# Altium footprint library iMag.PcbLib: 77 footprints (part 2 of 5)
Each footprint in its own frame and in the unit in brackets; x right, y up, seen from the top. Pads: shape width x height; smd on the part's side, far side on the other; paste and mask are expansions set on the pad; w line width, h text height; cw(c..) or ccw(c..) is an arc to the next point about the centre after c.
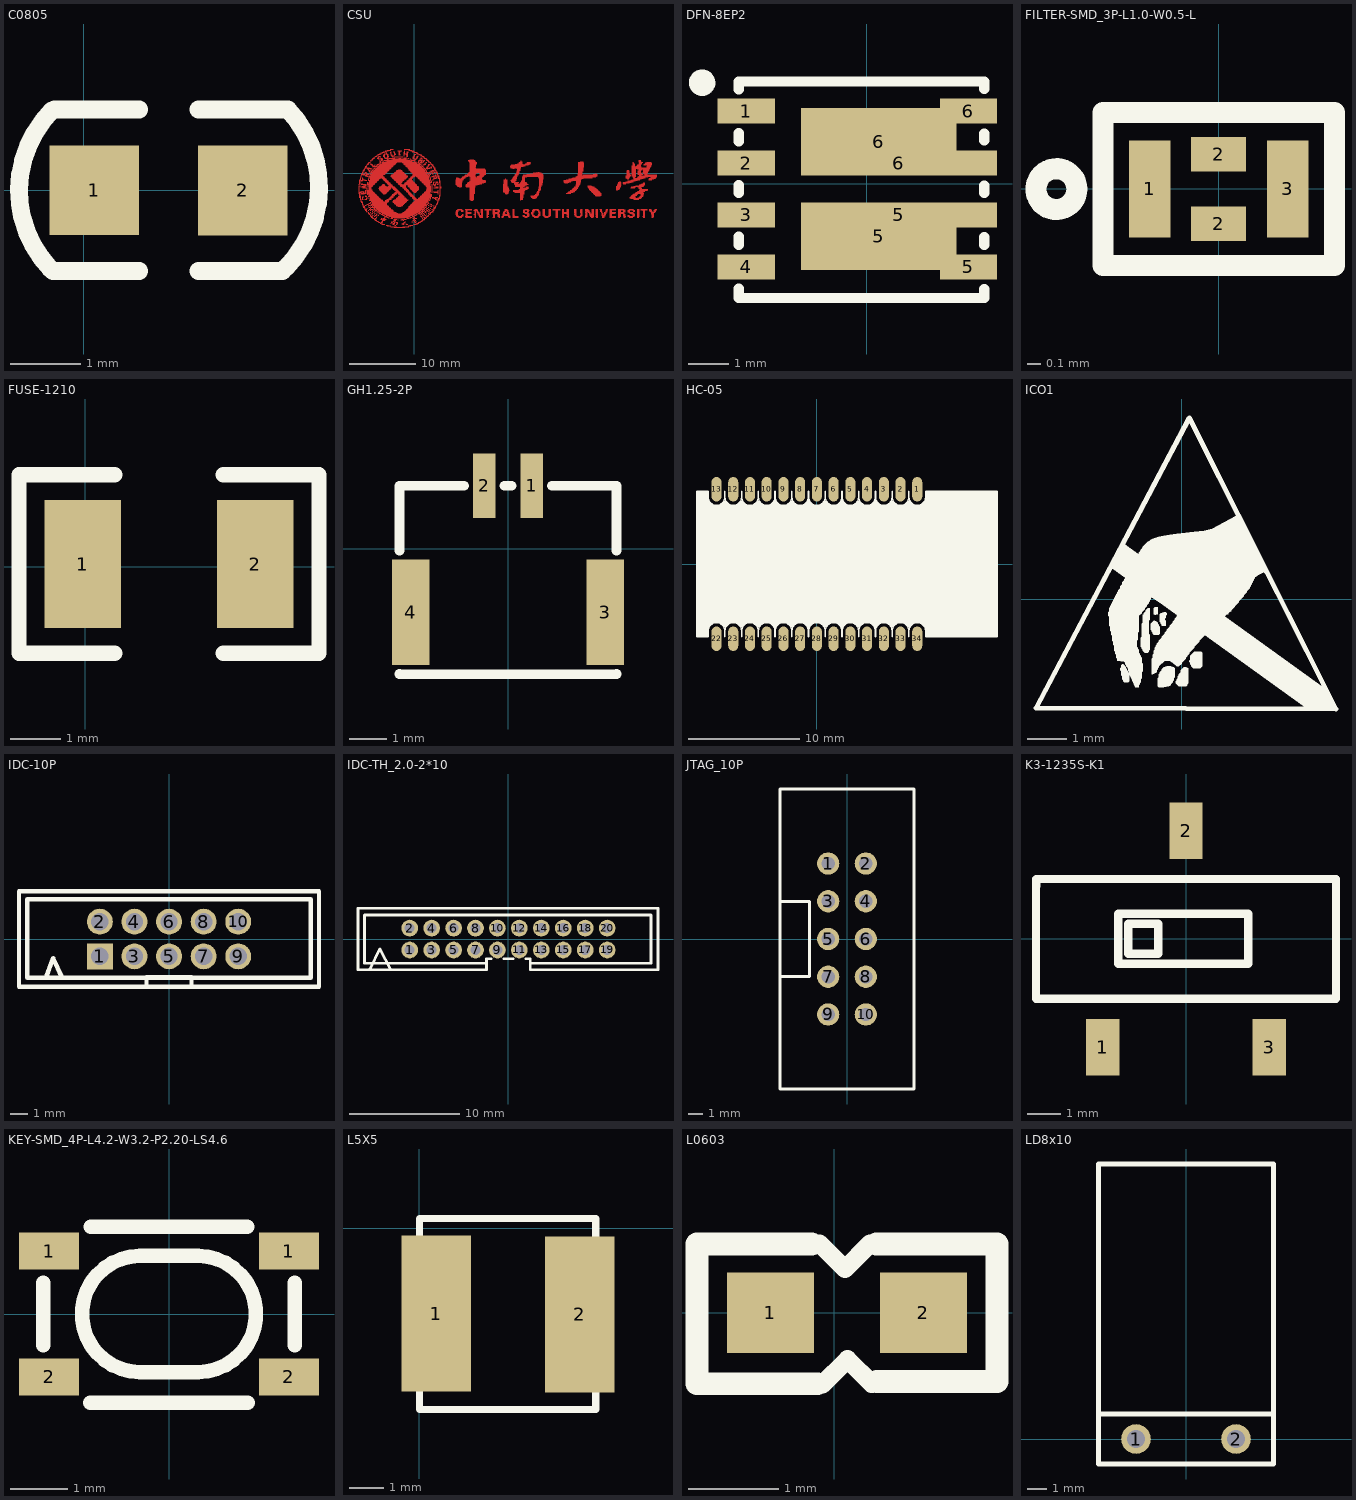
[diagram p1: the footprints below, top view; thin cyan lines are the x and y axes]

## C0805 [mil]
pads (2):
  rect 50x50 smd: 1(6,0) 2(88.7,-0.1)
Top Overlay:
  lines w10: -18.66,-43.67 cw(c27.24,-0.08) -17.7,44.5 ; -17.2,-45 31,-45 ; -16.3,45 31,45 ; 64,-45 111,-45 ; 64,45 113.1,45 ; 112.92,-43.04 ccw(c67.98,1.54) 114,45
3D body "User Library-0805 SMD Capacitor.STEP": height 30.39, standoff -0.39, extent 7.93,-24.5 86.67,24.71

## CSU [mm] "校徽"
Top Layer:
  drawing of 1935 lines, arcs and shapes, not listed
Top Solder:
  drawing of 2060 lines, arcs and shapes, not listed
Bottom Solder:
  drawing of 2060 lines, arcs and shapes, not listed

## DFN-8EP2 [mil] "DFN-8_L5.5-W5.2-P1.27-LS6.0-BL-EP2"
pads (10):
  rect 55x24 smd: 1(-116,70) 2(-116,20) 3(-116,-30) 4(-116,-80) 5(98,-80) 6(98,70)
  rect 150x65 smd: 5(11.5,-50.5) 6(11.5,40.5)
  rect 189x24 smd: 5(31,-30) 6(31,20)
Top Overlay:
  lines w10: -123.1,-110 113.1,-110 113.1,-101.62 ; -123.1,-108.5 -123.1,-101.1 ; -123.1,-58.9 -123.1,-51.1 ; -123.1,-8.9 -123.1,-1.1 ; -123.1,41.1 -123.1,48.9 ; -123.1,91.1 -123.1,98.5 113.1,98.5 113.1,91.62 ; 113.1,-58.85 113.1,-51.46 ; 113.1,-8.7 113.1,-1.82 ; 113.1,41.97 113.1,48.34
  lines w15.7: -158.6,92.5 cw(c-158.55,97.4) -158.5,92.5
3D body "User Library-powerpak_so_8.step": height 44.09, standoff 0, extent -138.93,-116.29 118.95,96.3

## FILTER-SMD_3P-L1.0-W0.5-L [mm]
pads (4):
  rect 0.3x0.7 smd: 1(-0.5,0) 3(0.5,0)
  rect 0.4x0.25 smd: 2(0,-0.25) 2(0,0.25)
Top Overlay:
  circle w0.152: c-1.175,-0.001 r0.148
  lines w0.152: -0.838,-0.554 -0.838,0.554 0.838,0.554 0.838,-0.554 -0.838,-0.554
3D body "cap_0402.STEP": height 0.5, standoff 0, extent -0.449,-0.254 0.551,0.246

## FUSE-1210 [mil]
height 43.31
pads (2):
  rect 60x100 smd: 1(-2,2) 2(133,2)
Top Overlay:
  lines w12: 23,-68 -52,-68 -52,72 23,72 ; 108,-68 183,-68 183,72 108,72
3D body "Fuse1210.STEP": height 26.57, standoff 0, extent 7.72,-48.69 134.29,52.69

## GH1.25-2P [mm]
pads (4):
  rect 0.6x1.7 smd: 1(0.625,1.675) 2(-0.625,1.675)
  rect 1x2.8 smd: 3(2.575,-1.675) 4(-2.575,-1.675)
Top Overlay:
  lines w0.254: -2.875,-3.306 -2.875,-3.325 2.875,-3.325 2.875,-3.306 ; -2.875,-0.044 -2.875,1.675 -1.156,1.675 ; -0.094,1.675 0.094,1.675 ; 1.156,1.675 2.875,1.675 2.875,-0.044

## HC-05 [mm] "HC-05/06/08V15"
pads (26):
  oval 0.9x2.2 smd: 1(9,6.7) 2(7.5,6.7) 3(6,6.7) 4(4.5,6.7) 5(3,6.7) 6(1.5,6.7) 7(0,6.7) 8(-1.5,6.7) 9(-3,6.7) 10(-4.5,6.7) 11(-6,6.7) 12(-7.5,6.7) 13(-9,6.7) 22(-9,-6.7) 23(-7.5,-6.7) 24(-6,-6.7) 25(-4.5,-6.7) 26(-3,-6.7) 27(-1.5,-6.7) 28(0,-6.7) 29(1.5,-6.7) 30(3,-6.7) 31(4.5,-6.7) 32(6,-6.7) 33(7.5,-6.7) 34(9,-6.7)
Top Overlay:
  rectangle: -8.6,5.275 -7.9,5.425
  rectangle: -8.41,5.4 -8.09,5.66
  rectangle: -7.1,5.275 -6.4,5.425
  rectangle: -6.91,5.4 -6.59,5.66
  rectangle: -5.6,5.275 -4.9,5.425
  rectangle: -5.41,5.4 -5.09,5.66
  rectangle: -4.1,5.275 -3.4,5.425
  rectangle: -3.91,5.4 -3.59,5.66
  rectangle: -2.6,5.275 -1.9,5.425
  rectangle: -2.41,5.4 -2.09,5.66
  rectangle: -1.1,5.275 -0.4,5.425
  rectangle: -0.91,5.4 -0.59,5.66
  rectangle: 0.4,5.275 1.1,5.425
  rectangle: 0.59,5.4 0.91,5.66
  rectangle: 1.9,5.275 2.6,5.425
  rectangle: 2.09,5.4 2.41,5.66
  rectangle: 3.4,5.275 4.1,5.425
  rectangle: 3.59,5.4 3.91,5.66
  rectangle: 4.9,5.275 5.6,5.425
  rectangle: 5.09,5.4 5.41,5.66
  rectangle: 6.4,5.275 7.1,5.425
  rectangle: 6.59,5.4 6.91,5.66
  rectangle: 7.9,5.275 8.6,5.425
  rectangle: 8.09,5.4 8.41,5.66
  rectangle: 9.4,5.275 10.1,5.425
  rectangle: 9.59,5.4 9.91,5.66
  rectangle: -8.6,-5.425 -7.9,-5.275
  rectangle: -8.41,-5.66 -8.09,-5.4
  rectangle: -7.1,-5.425 -6.4,-5.275
  rectangle: -6.91,-5.66 -6.59,-5.4
  rectangle: -5.6,-5.425 -4.9,-5.275
  rectangle: -5.41,-5.66 -5.09,-5.4
  rectangle: -4.1,-5.425 -3.4,-5.275
  rectangle: -3.91,-5.66 -3.59,-5.4
  rectangle: -2.6,-5.425 -1.9,-5.275
  rectangle: -2.41,-5.66 -2.09,-5.4
  rectangle: -1.1,-5.425 -0.4,-5.275
  rectangle: -0.91,-5.66 -0.59,-5.4
  rectangle: 0.4,-5.425 1.1,-5.275
  rectangle: 0.59,-5.66 0.91,-5.4
  rectangle: 1.9,-5.425 2.6,-5.275
  rectangle: 2.09,-5.66 2.41,-5.4
  rectangle: 3.4,-5.425 4.1,-5.275
  rectangle: 3.59,-5.66 3.91,-5.4
  rectangle: 4.9,-5.425 5.6,-5.275
  rectangle: 5.09,-5.66 5.41,-5.4
  rectangle: 6.4,-5.425 7.1,-5.275
  rectangle: 6.59,-5.66 6.91,-5.4
  rectangle: 7.9,-5.425 8.6,-5.275
  rectangle: 8.09,-5.66 8.41,-5.4
  rectangle: 9.4,-5.425 10.1,-5.275
  rectangle: 9.59,-5.66 9.91,-5.4
  rectangle: -10.75,-6.5 -9.75,6.5
  rectangle: 9.75,-6.5 16.15,6.5
  rectangle: -9.75,-5.3 9.75,5.3
  rectangle: -9.75,5.3 -9.425,5.475
  rectangle: -9.75,5.475 -9.6,5.675
  rectangle: -9.75,-5.475 -9.425,-5.3
  rectangle: -9.75,-5.675 -9.6,-5.475
  lines w0.152: -8.25,-5.85 -8.25,-6.5 -8.25,-6 ; 9.75,-6 ccw(c9,-6) 8.25,-6 ccw(c7.5,-6) 6.75,-6 ccw(c6,-6) 5.25,-6 ccw(c4.5,-6) 3.75,-6 ccw(c3,-6) 2.25,-6 ccw(c1.5,-6) 0.75,-6 ccw(c0,-6) -0.75,-6 ccw(c-1.5,-6) -2.25,-6 ccw(c-3,-6) -3.75,-6 ccw(c-4.5,-6) -5.25,-6 ccw(c-6,-6) -6.75,-6 ccw(c-7.5,-6) -8.25,-6 ; 9.75,-5.85 9.75,-6.5 16.15,-6.5 16.15,6.5 9.75,6.5 9.75,6 cw(c9,6) 8.25,6 ; -8.25,-6 ccw(c-9,-6) -9.75,-6 -9.75,-6.5 -10.75,-6.5 -10.75,6.5 -9.75,6.5 -9.75,6 ccw(c-9,6) -8.25,6 ; -8.25,6 ccw(c-7.5,6) -6.75,6 ; -8.25,6 -8.25,6.5 -8.25,6 ; -6.75,6 ccw(c-6,6) -5.25,6 ; -6.75,6 -6.75,6.5 -6.75,6 ; -5.25,6 ccw(c-4.5,6) -3.75,6 ; -5.25,6 -5.25,6.5 -5.25,6 ; -3.75,6 ccw(c-3,6) -2.25,6 ; -3.75,6 -3.75,6.5 -3.75,6 ; -2.25,6 ccw(c-1.5,6) -0.75,6 ; -2.25,6 -2.25,6.5 -2.25,6 ; -0.75,6 ccw(c0,6) 0.75,6 ; -0.75,6 -0.75,6.5 -0.75,6 ; 0.75,6 ccw(c1.5,6) 2.25,6 ; 0.75,6 0.75,6.5 0.75,6 ; 2.25,6 ccw(c3,6) 3.75,6 ; 2.25,6 2.25,6.5 2.25,6 ; 3.75,6 ccw(c4.5,6) 5.25,6 ; 3.75,6 3.75,6.5 3.75,6 ; 5.25,6 ccw(c6,6) 6.75,6 ; 5.25,6 5.25,6.5 5.25,6 ; 6.75,6 ccw(c7.5,6) 8.25,6 ; 6.75,6 6.75,6.5 6.75,6 ; 8.25,6 8.25,6.5 8.25,6 ; -6.75,-6.5 -6.75,-5.85 -6.75,-6.5 ; -5.25,-6.5 -5.25,-5.85 -5.25,-6.5 ; -3.75,-6.5 -3.75,-5.85 -3.75,-6.5 ; -2.25,-6.5 -2.25,-5.85 -2.25,-6.5 ; -0.75,-6.5 -0.75,-5.85 -0.75,-6.5 ; 0.75,-6.5 0.75,-5.85 0.75,-6.5 ; 2.25,-6.5 2.25,-5.85 2.25,-6.5 ; 3.75,-6.5 3.75,-5.85 3.75,-6.5 ; 5.25,-6.5 5.25,-5.85 5.25,-6.5 ; 6.75,-6.5 6.75,-5.85 6.75,-6.5 ; 8.25,-6.5 8.25,-5.85 8.25,-6.5
3D body "User Library-HC05(06).step": height 4.31, standoff 0, extent -10.833,-6.5 16.167,6.5

## ICO1 [mm]
Top Overlay:
  drawing of 14 lines, arcs and shapes, not listed

## IDC-10P [mm]
pads (10):
  rect 1.5x1.5 hole 1: 1(-4,-1)
  round 1.5 hole 1: 2(-4,1) 3(-2,-1) 4(-2,1) 5(0,-1) 6(0,1) 7(2,-1) 8(2,1) 9(4,-1) 10(4,1)
Top Overlay:
  lines w0.254: -7.1,-2.2 -6.7,-1.1 -6.2,-2.2 ; -1.3,-2.749 -1.3,-2.201 1.301,-2.201 1.301,-2.749 ; -8.672,-2.75 8.668,-2.75 8.668,2.75 -8.672,2.75 -8.672,-2.75 ; -8.2,-2.25 8.2,-2.25 8.2,2.3 -8.2,2.3 -8.2,-2.25

## IDC-TH_2.0-2*10 [mil]
pads (20):
  round 60 hole 36: 1(-354.35,-39.35) 2(-354.35,39.35) 3(-275.55,-39.35) 4(-275.55,39.35) 5(-196.85,-39.35) 6(-196.85,39.35) 7(-118.15,-39.35) 8(-118.15,39.35) 9(-39.35,-39.35) 10(-39.35,39.35) 11(39.35,-39.35) 12(39.35,39.35) 13(118.15,-39.35) 14(118.15,39.35) 15(196.85,-39.35) 16(196.85,39.35) 17(275.55,-39.35) 18(275.55,39.35) 19(354.35,-39.35) 20(354.35,39.35)
Top Overlay:
  lines w10: -539.95,-110.07 -539.95,110.41 ; -539.82,-110.19 -79.19,-110.19 -79.19,-106.25 -79.19,-70.82 -62.49,-70.82 ; -537.85,110.29 536.95,110.29 536.95,-110.19 ; -500.45,86.66 511.36,86.66 511.36,-86.56 82.23,-86.56 ; -496.55,-106.25 -461.08,-35.38 -421.71,-110.19 ; -496.51,86.66 -516.2,86.66 -516.2,-86.56 -79.19,-86.56 ; -16.21,-70.82 16.21,-70.82 ; 62.49,-70.82 78.29,-70.82 78.29,-98.38 78.29,-110.19 534.98,-110.19

## JTAG_10P [mm] "JTAG_10P"
pads (10):
  round 1.5 hole 0.9: 1(-1.27,5.08) 2(1.27,5.08) 3(-1.27,2.54) 4(1.27,2.54) 5(-1.27,0) 6(1.27,0) 7(-1.27,-2.54) 8(1.27,-2.54) 9(-1.27,-5.08) 10(1.27,-5.08)
Top Overlay:
  lines w0.2: -4.5,-2.54 -2.54,-2.54 -2.54,2.54 -4.5,2.54 ; -4.5,-10.1 4.5,-10.1 4.5,10.1 -4.5,10.1 -4.5,-10.1
3D body "User Library-IDC Socket Male 10pin Straight THT Goldplated 2_54mm.step": height 9.03, standoff -3.37, extent -4.425,-10.15 4.425,10.15

## K3-1235S-K1 [mm]
pads (3):
  rect 1x1.7 smd: 1(-2.5,-3.25) 2(-0.002,3.25) 3(2.5,-3.25)
Top Overlay:
  lines w0.254: -4.502,-1.799 -4.502,1.284 -4.5,1.8 4.499,1.8 4.499,-1.799 -4.502,-1.799 ; -2.032,-0.738 -2.032,0.762 1.868,0.762 1.868,-0.738 -2.032,-0.738 ; -1.732,-0.438 -0.832,-0.438 -0.832,0.462 -1.732,0.462 -1.732,-0.438

## KEY-SMD_4P-L4.2-W3.2-P2.20-LS4.6 [mm]
pads (4):
  rect 1.05x0.65 smd: 1(-2.1,1.1) 1(2.1,1.1) 2(-2.1,-1.1) 2(2.1,-1.1)
Top Overlay:
  lines w0.254: -2.2,-0.544 -2.2,0.544 ; -1.381,-1.55 1.381,-1.55 ; -1.366,1.524 1.366,1.524 ; 2.2,-0.544 2.2,0.544 ; -0.508,-1.016 cw(c-0.508,0) -0.508,1.016 0.508,1.016 cw(c0.508,0) 0.508,-1.016 -0.508,-1.016
3D body "User Library-Switch-CK-KMR2.STEP": height 2.1, standoff 0, extent -2.3,-1.5 2.3,1.5

## L5X5 [mm]
pads (2):
  rect 2x4.5 smd: 1(0.483,-2.464) 2(4.623,-2.489)
Top Overlay:
  lines w0.203: 0,-5.232 0,0.279 5.08,0.279 5.08,-5.232 0,-5.232
3D body "CDRH4D28.step": height 2.91, standoff 0, extent 0.065,-4.914 4.965,-0.014

## L0603 [mil]
pads (2):
  rect 38x35 smd: 1(-28,0) 2(38.87,0)
Top Overlay:
  lines w8: -6.53,30.27 4.6,19.14 15.58,30.12 ; -5.3,-31.36 5.7,-20.36 16.32,-30.98
  lines w10: -9.9,30 -60,30 -60,-31 -7.3,-31 ; 18.4,30 71,30 71,-30 18.6,-30
3D body: height 20, standoff 0, extent -24,-15 -16,15
3D body: height 20, standoff 0, extent 28,-15 36,15
3D body: height 20, standoff 0, extent -16,-15 28,15

## LD8x10 [mm] "直插8x10mm电感"
pads (2):
  round 1.5 hole 0.9: 1(-2.54,0) 2(2.54,0)
Top Overlay:
  lines w0.254: -4.445,1.27 4.445,1.27 ; -4.445,-1.27 4.445,-1.27 4.445,13.97 -4.445,13.97 -4.445,-1.27
3D body: height 4.4, standoff 3.6, extent 2.141,-0.397 2.94,0.397
3D body: height 4.4, standoff 3.6, extent -2.94,-0.397 -2.14,0.397
3D body: height 4.4, standoff 3.6, extent 2.143,0 2.94,5.08
3D body: height 4.4, standoff 3.6, extent -2.938,0 -2.142,5.08
3D body: height 4, standoff -2, extent 2.143,-0.399 2.94,0.399
3D body: height 4, standoff -2, extent -2.938,-0.399 -2.142,0.399
3D body: height 8, standoff 0, extent -4,3.255 4,13.255